# Altium footprint library GyokuRe.PcbLib: 1248 footprints (part 75 of 78)
Each footprint in its own frame and in the unit in brackets; x right, y up, seen from the top. Pads: shape width x height; smd on the part's side, far side on the other; paste and mask are expansions set on the pad; w line width, h text height; cw(c..) or ccw(c..) is an arc to the next point about the centre after c.
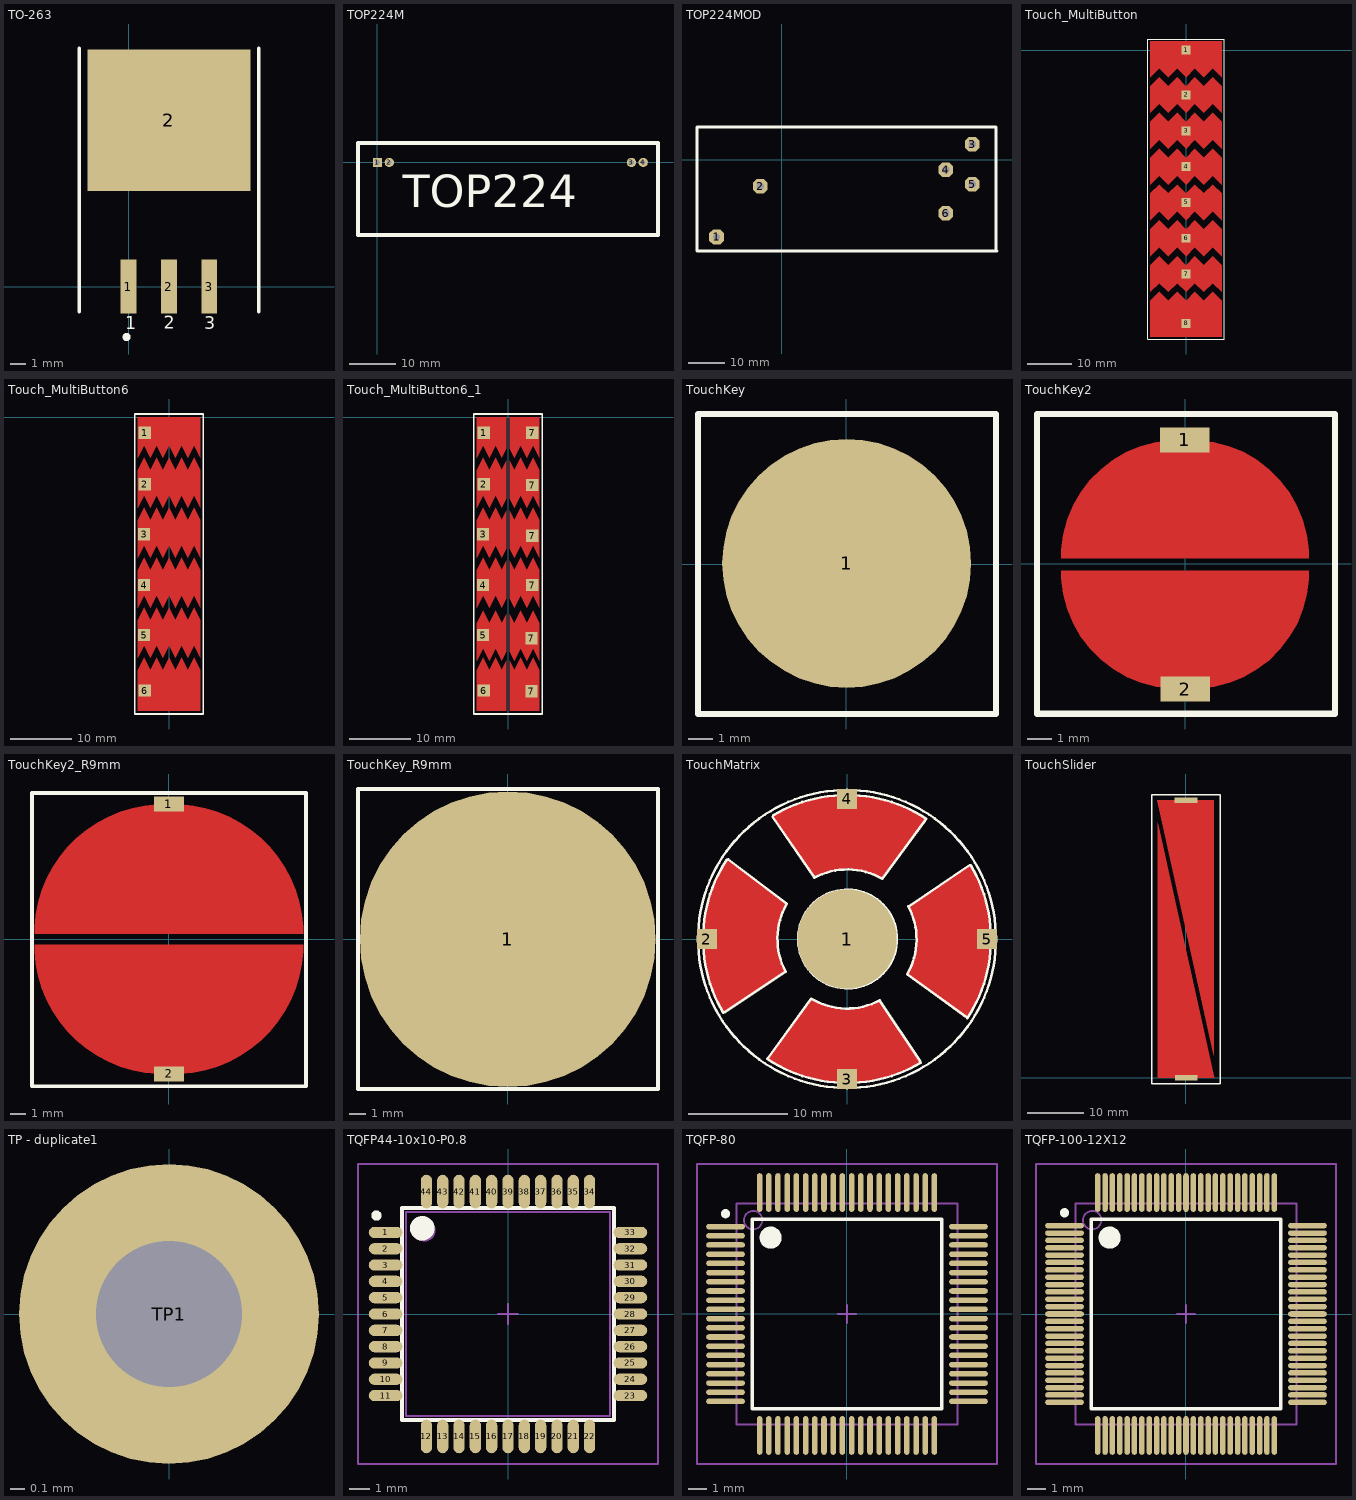
[diagram p74: the footprints below, top view; thin cyan lines are the x and y axes]

## TO-263 [mm]
pads (4):
  rect 1x3.4 smd: 1(-0.006,0.009) 2(2.534,0.009) 3(5.074,0.009)
  rect 10.25x8.9 smd: 2(2.534,10.459)
Top Overlay:
  circle w0.25: c-0.126,-3.166 r0.125
  lines w0.2: -3.106,-1.591 -3.106,15.009 ; 8.194,-1.591 8.194,15.009
  text "2" at 2.213,-2.653 h0.8
  text "3" at 4.774,-2.691 h0.8
  text "1" at -0.201,-2.666 h0.8
Mechanical 13:
  text ".Designator" at -1.422,4.521 h2.03
3D body: height 2.9, standoff 0, extent 4.694,0.75 5.456,1.25
3D body: height 2.9, standoff 0, extent -0.381,0.76 0.381,1.26
3D body: height 0.5, standoff 0, extent 4.694,-1.153 5.456,1
3D body: height 2.9, standoff 2.4, extent 4.475,1 5.675,3.8
3D body: height 2.9, standoff 2.4, extent 1.94,2.375 3.14,3.81
3D body: height 2.9, standoff 2.4, extent -0.6,1.01 0.6,3.81
3D body: height 1.3, standoff 0, extent -2.46,13.01 7.54,14.21
3D body: height 4.5, standoff 0, extent -2.46,3.81 7.54,13.01
3D body: height 0.5, standoff 0, extent -0.381,-1.143 0.381,1.01

## TOP224M [mm] "module TOP224"
pads (4):
  rect 2x2 hole 1: 1(0,0)
  round 2 hole 1: 2(2.54,0) 3(54.61,0) 4(57.15,0)
Top Overlay:
  lines w0.8: -4.191,-15.621 -4.191,4.191 60.325,4.191 60.325,-15.621 -4.191,-15.621
  text "TOP224" at 5.461,-9.652 h7

## TOP224MOD [mm]
pads (6):
  oct 4x4 hole 2: 1(-17.78,-21.082) 2(-5.842,-7.239) 3(51.943,4.191) 4(44.704,-2.794) 5(51.943,-6.731) 6(44.704,-14.605)
Bottom Layer:
  lines w1.016: -5.842,-7.239 -5.715,-7.112
  lines w1.524: -17.78,-21.082 -16.51,-21.082
Top Overlay:
  lines w0.762: -23.114,-24.892 -23.114,8.89 58.42,8.89 58.42,-24.638 58.674,-24.892 -23.114,-24.892

## Touch_MultiButton [mm]
pads (8):
  rect 2x2 smd paste+0 mask+0: 1(0,0) 2(0,-10) 3(0,-18) 4(0,-26) 5(0,-34) 6(0,-42) 7(0,-50) 8(0,-61)
Top Layer:
  region: 8,-40 6,-38 4,-40 2,-38 0,-40 -2,-38 -4,-40 -6,-38 -8,-40 -8,-46 -6,-44 -4,-46 -2,-44 0,-46 2,-44 4,-46 6,-44 8,-46
  region: 8,-48 6,-46 4,-48 2,-46 0,-48 -2,-46 -4,-48 -6,-46 -8,-48 -8,-54 -6,-52 -4,-54 -2,-52 0,-54 2,-52 4,-54 6,-52 8,-54
  region: 8,-32 6,-30 4,-32 2,-30 0,-32 -2,-30 -4,-32 -6,-30 -8,-32 -8,-38 -6,-36 -4,-38 -2,-36 0,-38 2,-36 4,-38 6,-36 8,-38
  region: 8,-24 6,-22 4,-24 2,-22 0,-24 -2,-22 -4,-24 -6,-22 -8,-24 -8,-30 -6,-28 -4,-30 -2,-28 0,-30 2,-28 4,-30 6,-28 8,-30
  region: -8,-64 -8,-56 -7,-55 -6,-54 -4,-56 -2,-54 0,-56 2,-54 4,-56 6,-54 7,-55 8,-56 8,-64
  region: 8,-16 6,-14 4,-16 2,-14 0,-16 -2,-14 -4,-16 -6,-14 -8,-16 -8,-22 -6,-20 -4,-22 -2,-20 0,-22 2,-20 4,-22 6,-20 8,-22
  region: 8,-8 6,-6 4,-8 2,-6 0,-8 -2,-6 -4,-8 -6,-6 -8,-8 -8,-14 -6,-12 -4,-14 -2,-12 0,-14 2,-12 4,-14 6,-12 8,-14
  region: 8,2 8,-6 7,-5 6,-4 4,-6 3,-5 2,-4 0,-6 -2,-4 -3,-5 -4,-6 -6,-4 -7,-5 -8,-6 -8,2
Top Overlay:
  lines w0.254: -8.5,-64.5 8.5,-64.5 8.5,2.5 -8.5,2.5 -8.5,-64.5

## Touch_MultiButton6 [mm]
pads (6):
  rect 2x2 smd paste+0 mask+0: 1(-3.937,-2.54) 2(-3.937,-10.922) 3(-4.064,-19.05) 4(-4.064,-27.305) 5(-4.064,-35.433) 6(-3.937,-44.45)
Top Layer:
  region: 5.08,0 5.08,-6.604 4.064,-4.572 3.048,-6.604 2.032,-4.572 1.016,-6.604 0,-4.572 -1.016,-6.604 -2.032,-4.572 -3.048,-6.604 -4.064,-4.572 -5.08,-6.604 -5.08,0
  region: 5.08,-8.636 4.064,-6.604 3.048,-8.636 2.032,-6.604 1.016,-8.636 0,-6.604 -1.016,-8.636 -2.032,-6.604 -3.048,-8.636 -4.064,-6.604 -5.08,-8.636 -5.08,-14.732 -4.064,-12.7 -3.048,-14.732 -2.032,-12.7 -1.016,-14.732 0,-12.7 1.016,-14.732 2.032,-12.7 3.048,-14.732 4.064,-12.7 5.08,-14.732
  region: 5.08,-16.764 4.064,-14.732 3.048,-16.764 2.032,-14.732 1.016,-16.764 0,-14.732 -1.016,-16.764 -2.032,-14.732 -3.048,-16.764 -4.064,-14.732 -5.08,-16.764 -5.08,-22.86 -4.064,-20.828 -3.048,-22.86 -2.032,-20.828 -1.016,-22.86 0,-20.828 1.016,-22.86 2.032,-20.828 3.048,-22.86 4.064,-20.828 5.08,-22.86
  region: 5.08,-24.892 4.064,-22.86 3.048,-24.892 2.032,-22.86 1.016,-24.892 0,-22.86 -1.016,-24.892 -2.032,-22.86 -3.048,-24.892 -4.064,-22.86 -5.08,-24.892 -5.08,-30.988 -4.064,-28.956 -3.048,-30.988 -2.032,-28.956 -1.016,-30.988 0,-28.956 1.016,-30.988 2.032,-28.956 3.048,-30.988 4.064,-28.956 5.08,-30.988
  region: 5.08,-33.02 4.064,-30.988 3.048,-33.02 2.032,-30.988 1.016,-33.02 0,-30.988 -1.016,-33.02 -2.032,-30.988 -3.048,-33.02 -4.064,-30.988 -5.08,-33.02 -5.08,-39.116 -4.064,-37.084 -3.048,-39.116 -2.032,-37.084 -1.016,-39.116 0,-37.084 1.016,-39.116 2.032,-37.084 3.048,-39.116 4.064,-37.084 5.08,-39.116
  region: -5.08,-47.752 -5.08,-41.148 -4.064,-39.116 -3.048,-41.148 -2.032,-39.116 -1.016,-41.148 0,-39.116 1.016,-41.148 2.032,-39.116 3.048,-41.148 4.064,-39.116 5.08,-41.148 5.08,-47.752
Top Overlay:
  lines w0.254: -5.588,-48.26 5.588,-48.26 5.588,0.508 -5.588,0.508 -5.588,-48.26

## Touch_MultiButton6_1 [mm]
pads (12):
  rect 2x2 smd paste+0 mask+0: 1(-3.937,-2.54) 2(-3.937,-10.922) 3(-4.064,-19.05) 4(-4.064,-27.305) 5(-4.064,-35.433) 6(-3.937,-44.45) 7(3.81,-44.577) 7(3.81,-35.941) 7(3.937,-27.305) 7(3.937,-19.304) 7(3.937,-11.049) 7(3.937,-2.54)
Top Layer:
  region: -0.254,0 -0.254,-5.08 -1.016,-6.604 -2.032,-4.572 -3.048,-6.604 -4.064,-4.572 -5.08,-6.604 -5.08,0
  region: -0.254,-7.112 -1.016,-8.636 -2.032,-6.604 -3.048,-8.636 -4.064,-6.604 -5.08,-8.636 -5.08,-14.732 -4.064,-12.7 -3.048,-14.732 -2.032,-12.7 -1.016,-14.732 -0.254,-13.208
  region: -5.08,-47.752 -5.08,-41.148 -4.064,-39.116 -3.048,-41.148 -2.032,-39.116 -1.016,-41.148 -0.254,-39.624 -0.254,-47.752
  region: 5.08,0 5.08,-6.604 4.064,-4.572 3.048,-6.604 2.032,-4.572 1.016,-6.604 0.254,-5.08 0.254,0
  region: 5.08,-8.636 4.064,-6.604 3.048,-8.636 2.032,-6.604 1.016,-8.636 0.254,-7.112 0.254,-13.208 1.016,-14.732 2.032,-12.7 3.048,-14.732 4.064,-12.7 5.08,-14.732
  region: 5.08,-16.764 4.064,-14.732 3.048,-16.764 2.032,-14.732 1.016,-16.764 0.254,-15.24 0.254,-21.336 1.016,-22.86 2.032,-20.828 3.048,-22.86 4.064,-20.828 5.08,-22.86
  region: -0.254,-15.24 -1.016,-16.764 -2.032,-14.732 -3.048,-16.764 -4.064,-14.732 -5.08,-16.764 -5.08,-22.86 -4.064,-20.828 -3.048,-22.86 -2.032,-20.828 -1.016,-22.86 -0.254,-21.336
  region: 5.08,-24.892 4.064,-22.86 3.048,-24.892 2.032,-22.86 1.016,-24.892 0.254,-23.368 0.254,-29.464 1.016,-30.988 2.032,-28.956 3.048,-30.988 4.064,-28.956 5.08,-30.988
  region: -0.254,-23.368 -1.016,-24.892 -2.032,-22.86 -3.048,-24.892 -4.064,-22.86 -5.08,-24.892 -5.08,-30.988 -4.064,-28.956 -3.048,-30.988 -2.032,-28.956 -1.016,-30.988 -0.254,-29.464
  region: 5.08,-33.528 4.064,-31.496 3.048,-33.528 2.032,-31.496 1.016,-33.528 0.254,-32.004 0.254,-38.1 1.016,-39.624 2.032,-37.592 3.048,-39.624 4.064,-37.592 5.08,-39.624
  region: -0.254,-32.004 -1.016,-33.528 -2.032,-31.496 -3.048,-33.528 -4.064,-31.496 -5.08,-33.528 -5.08,-39.624 -4.064,-37.592 -3.048,-39.624 -2.032,-37.592 -1.016,-39.624 -0.254,-38.1
  region: 0.254,-47.752 0.254,-39.624 1.016,-41.148 2.032,-39.116 3.048,-41.148 4.064,-39.116 5.08,-41.148 5.08,-47.752
Top Overlay:
  lines w0.254: -5.588,-48.26 5.588,-48.26 5.588,0.508 -5.588,0.508 -5.588,-48.26

## TouchKey [mm] "Radius 5mm"
pads (1):
  round 10 smd mask+0: 1(0.025,0.025)
Top Overlay:
  lines w0.254: -5.95,-6.025 -5.95,6.025 6.025,6.025 6.025,-6.025 -5.95,-6.025

## TouchKey2 [mm] "Radius 5mm"
pads (2):
  rect 2x1 smd mask+0: 1(-0.012,4.983) 2(0.012,-5.034)
Top Layer:
  region: -0.253,4.978 -0.563,4.978 -1.177,4.898 -1.775,4.737 -2.347,4.5 -2.884,4.19 -3.375,3.813 -3.813,3.375 -4.19,2.884 -4.5,2.347 -4.737,1.775 -4.898,1.177 -4.978,0.563 -4.978,0.253 -4.978,0.229 4.978,0.229 4.978,0.54 4.897,1.157 4.736,1.759 4.498,2.334 4.186,2.873 3.807,3.367 3.367,3.807 2.873,4.186 2.334,4.498 1.759,4.736 1.157,4.897 0.54,4.978 0.229,4.978
  region: 0.253,-5.029 0.563,-5.029 1.177,-4.948 1.775,-4.788 2.347,-4.551 2.884,-4.241 3.375,-3.864 3.813,-3.426 4.19,-2.935 4.5,-2.398 4.737,-1.826 4.898,-1.228 4.978,-0.613 4.978,-0.304 4.978,-0.279 -4.978,-0.279 -4.978,-0.591 -4.897,-1.208 -4.736,-1.809 -4.498,-2.385 -4.186,-2.924 -3.807,-3.418 -3.367,-3.858 -2.873,-4.237 -2.334,-4.549 -1.759,-4.787 -1.157,-4.948 -0.54,-5.029 -0.229,-5.029
Top Overlay:
  lines w0.254: -5.95,-6.025 -5.95,6.025 6.025,6.025 6.025,-6.025 -5.95,-6.025

## TouchKey2_R9mm [mm] "Radius 9mm"
pads (2):
  rect 2x1 smd paste+0 mask+0: 1(0,8.992) 2(0.025,-8.992)
Top Layer:
  region: 0.33,-8.992 0.753,-8.992 1.595,-8.909 2.425,-8.744 3.235,-8.498 4.016,-8.174 4.762,-7.775 5.466,-7.305 6.12,-6.769 6.718,-6.17 7.255,-5.517 7.725,-4.813 8.123,-4.067 8.447,-3.285 8.693,-2.476 8.858,-1.646 8.941,-0.804 8.941,-0.381 -8.941,-0.381 -8.941,-0.804 -8.858,-1.646 -8.693,-2.476 -8.447,-3.285 -8.123,-4.067 -7.725,-4.813 -7.255,-5.517 -6.718,-6.17 -6.12,-6.769 -5.466,-7.305 -4.762,-7.775 -4.016,-8.174 -3.235,-8.498 -2.425,-8.744 -1.595,-8.909 -0.753,-8.992 -0.33,-8.992
  region: -0.33,8.966 -0.753,8.966 -1.595,8.883 -2.425,8.718 -3.235,8.473 -4.016,8.149 -4.762,7.75 -5.466,7.28 -6.12,6.743 -6.718,6.145 -7.255,5.491 -7.725,4.788 -8.123,4.042 -8.447,3.26 -8.693,2.45 -8.858,1.621 -8.941,0.779 -8.941,0.356 8.941,0.356 8.941,0.779 8.858,1.621 8.693,2.45 8.447,3.26 8.123,4.042 7.725,4.788 7.255,5.491 6.718,6.145 6.12,6.743 5.466,7.28 4.762,7.75 4.016,8.149 3.235,8.473 2.425,8.718 1.595,8.883 0.753,8.966 0.33,8.966
Top Overlay:
  lines w0.254: -9.119,-9.804 -9.119,9.728 9.144,9.728 9.144,-9.804 -9.119,-9.804

## TouchKey_R9mm [mm] "Radius 9mm"
pads (1):
  round 18 smd paste+0 mask+0: 1(0,0)
Top Overlay:
  lines w0.254: -9.119,-9.119 -9.119,9.144 9.144,9.144 9.144,-9.119 -9.119,-9.119

## TouchMatrix [mm]
pads (5):
  round 10 smd paste+0 mask+0: 1(0,0)
  rect 2x2 smd paste+0 mask+0: 2(-14.097,0) 3(0,-14.097) 4(0,14.097) 5(14.097,0)
Top Layer:
  region: -3.302,6.223 -7.366,12.192 -7.366,12.319 -7.366,12.395 -7.308,12.535 -7.201,12.642 -7.061,12.7 -6.985,12.7 -4.699,13.716 -1.905,14.351 0.635,14.478 3.175,14.097 5.08,13.589 7.62,12.319 7.671,12.319 7.764,12.28 7.835,12.209 7.874,12.116 7.874,12.065 7.874,11.811 3.556,6.096 2.54,6.604 1.27,6.858 0.254,7.112 -1.27,6.985 -2.667,6.477
  region: 6.223,3.302 12.192,7.366 12.319,7.366 12.395,7.366 12.535,7.308 12.642,7.201 12.7,7.061 12.7,6.985 13.716,4.699 14.351,1.905 14.478,-0.635 14.097,-3.175 13.589,-5.08 12.319,-7.62 12.319,-7.671 12.28,-7.764 12.209,-7.835 12.116,-7.874 12.065,-7.874 11.811,-7.874 6.096,-3.556 6.604,-2.54 6.858,-1.27 7.112,-0.254 6.985,1.27 6.477,2.667
  region: -6.223,-3.302 -12.192,-7.366 -12.319,-7.366 -12.395,-7.366 -12.535,-7.308 -12.642,-7.201 -12.7,-7.061 -12.7,-6.985 -13.716,-4.699 -14.351,-1.905 -14.478,0.635 -14.097,3.175 -13.589,5.08 -12.319,7.62 -12.319,7.671 -12.28,7.764 -12.209,7.835 -12.116,7.874 -12.065,7.874 -11.811,7.874 -6.096,3.556 -6.604,2.54 -6.858,1.27 -7.112,0.254 -6.985,-1.27 -6.477,-2.667
  region: 3.302,-6.223 7.366,-12.192 7.366,-12.319 7.366,-12.395 7.308,-12.535 7.201,-12.642 7.061,-12.7 6.985,-12.7 4.699,-13.716 1.905,-14.351 -0.635,-14.478 -3.175,-14.097 -5.08,-13.589 -7.62,-12.319 -7.671,-12.319 -7.764,-12.28 -7.835,-12.209 -7.874,-12.116 -7.874,-12.065 -7.874,-11.811 -3.556,-6.096 -2.54,-6.604 -1.27,-6.858 -0.254,-7.112 1.27,-6.985 2.667,-6.477
Top Overlay:
  circle w0.254: c0,0 r15
  circle w0.254: c0.051,0 r4.973
  lines w0.254: -12.445,-7.441 cw(c0,0) -12.099,7.992 ; -12.319,-7.366 -6.223,-3.302 ; -11.938,8.001 -6.096,3.556 ; -8.001,-12.065 -3.683,-6.096 ; -7.992,-12.099 ccw(c0,0) 7.441,-12.445 ; -7.493,12.319 -3.299,6.225 ; -7.441,12.445 cw(c0,0) 7.992,12.099 ; -6.177,-3.278 cw(c0,0.015) -6.053,3.531 ; -3.605,-6.009 ccw(c-0.015,0) 3.292,-6.17 ; -3.292,6.17 cw(c0.015,0) 3.531,6.053 ; 3.302,-6.223 7.366,-12.319 ; 3.556,6.096 7.874,11.938 ; 6.053,-3.531 ccw(c0,-0.015) 6.17,3.292 ; 6.096,-3.556 12.065,-7.874 ; 6.294,3.333 12.354,7.441 ; 12.099,-7.992 ccw(c0,0) 12.445,7.441

## TouchSlider [mm]
pads (2):
  rect 4x1 smd paste+0 mask+0: 1(0.025,0.025) 2(0,49.025)
Top Layer:
  region: 5,0.025 -5,0.05 -4.975,45.05
  region: -5.1,49.025 4.9,49 4.875,4
Top Overlay:
  lines w0.254: -6,-1.025 6.025,-1.025 6.025,50.025 -6,50.025 -6,-1.025

## TP - duplicate1 [mil] "Connect 1"
pads (1):
  round 80 hole 39: TP1(0,0)
3D body "socket 1-1.stp": height 178.54, standoff -113.98, extent -50,-50 50,50

## TQFP44-10x10-P0.8 [mm] "QFP, 44-Leads, Body 10x10mm, Pitch 0.8mm, IPC High Density"
height 2.44
pads (44):
  oval 1.65x0.55 smd: 1(-6,4) 2(-6,3.2) 3(-6,2.4) 4(-6,1.6) 5(-6,0.8) 6(-6,0) 7(-6,-0.8) 8(-6,-1.6) 9(-6,-2.4) 10(-6,-3.2) 11(-6,-4) 23(6,-4) 24(6,-3.2) 25(6,-2.4) 26(6,-1.6) 27(6,-0.8) 28(6,0) 29(6,0.8) 30(6,1.6) 31(6,2.4) 32(6,3.2) 33(6,4)
  oval 0.55x1.65 smd: 12(-4,-6) 13(-3.2,-6) 14(-2.4,-6) 15(-1.6,-6) 16(-0.8,-6) 17(0,-6) 18(0.8,-6) 19(1.6,-6) 20(2.4,-6) 21(3.2,-6) 22(4,-6) 34(4,6) 35(3.2,6) 36(2.4,6) 37(1.6,6) 38(0.8,6) 39(0,6) 40(-0.8,6) 41(-1.6,6) 42(-2.4,6) 43(-3.2,6) 44(-4,6)
Top Overlay:
  circle w0.6: c-4.2,4.2 r0.3
  circle w0.25: c-6.45,4.825 r0.125
  lines w0.2: -5.2,-5.2 5.2,-5.2 5.2,5.2 -5.2,5.2 -5.2,-5.2
Mechanical 13:
  circle w0.1: c-4.1,4.1 r0.5
  lines w0.1: -5,-5 5,-5 5,5 -5,5 -5,-5
Mechanical 15:
  lines w0.1: -0.5,0 0.5,0 ; 0,-0.5 0,0.5 ; -7.35,-7.35 7.35,-7.35 7.35,7.35 -7.35,7.35 -7.35,-7.35
3D body "User Library-TQFP44.step": height 1.07, standoff 0, extent -5.994,-5.994 6.006,6.006

## TQFP-80 [mm] "Thin QFP, 80-Leads, Body 12x12mm, Pitch 0.5mm, IPC Low Density"
height 1.2
pads (80):
  oval 2.1x0.3 smd: 1(-6.6,4.75) 2(-6.6,4.25) 3(-6.6,3.75) 4(-6.6,3.25) 5(-6.6,2.75) 6(-6.6,2.25) 7(-6.6,1.75) 8(-6.6,1.25) 9(-6.6,0.75) 10(-6.6,0.25) 11(-6.6,-0.25) 12(-6.6,-0.75) 13(-6.6,-1.25) 14(-6.6,-1.75) 15(-6.6,-2.25) 16(-6.6,-2.75) 17(-6.6,-3.25) 18(-6.6,-3.75) 19(-6.6,-4.25) 20(-6.6,-4.75) 41(6.6,-4.75) 42(6.6,-4.25) 43(6.6,-3.75) 44(6.6,-3.25) 45(6.6,-2.75) 46(6.6,-2.25) 47(6.6,-1.75) 48(6.6,-1.25) 49(6.6,-0.75) 50(6.6,-0.25) 51(6.6,0.25) 52(6.6,0.75) 53(6.6,1.25) 54(6.6,1.75) 55(6.6,2.25) 56(6.6,2.75) 57(6.6,3.25) 58(6.6,3.75) 59(6.6,4.25) 60(6.6,4.75)
  oval 0.3x2.1 smd: 21(-4.75,-6.6) 22(-4.25,-6.6) 23(-3.75,-6.6) 24(-3.25,-6.6) 25(-2.75,-6.6) 26(-2.25,-6.6) 27(-1.75,-6.6) 28(-1.25,-6.6) 29(-0.75,-6.6) 30(-0.25,-6.6) 31(0.25,-6.6) 32(0.75,-6.6) 33(1.25,-6.6) 34(1.75,-6.6) 35(2.25,-6.6) 36(2.75,-6.6) 37(3.25,-6.6) 38(3.75,-6.6) 39(4.25,-6.6) 40(4.75,-6.6) 61(4.75,6.6) 62(4.25,6.6) 63(3.75,6.6) 64(3.25,6.6) 65(2.75,6.6) 66(2.25,6.6) 67(1.75,6.6) 68(1.25,6.6) 69(0.75,6.6) 70(0.25,6.6) 71(-0.25,6.6) 72(-0.75,6.6) 73(-1.25,6.6) 74(-1.75,6.6) 75(-2.25,6.6) 76(-2.75,6.6) 77(-3.25,6.6) 78(-3.75,6.6) 79(-4.25,6.6) 80(-4.75,6.6)
Top Overlay:
  circle w0.6: c-4.15,4.15 r0.3
  circle w0.25: c-6.6,5.45 r0.125
  lines w0.2: -5.15,-5.15 5.15,-5.15 5.15,5.15 -5.15,5.15 -5.15,-5.15
Mechanical 13:
  circle w0.1: c-5.1,5.1 r0.5
  lines w0.1: -6,-6 6,-6 6,6 -6,6 -6,-6
Mechanical 15:
  lines w0.1: -0.5,0 0.5,0 ; 0,-0.5 0,0.5 ; -8.15,-8.15 8.15,-8.15 8.15,8.15 -8.15,8.15 -8.15,-8.15
3D body: height 1.2, standoff 0, extent -6,-6 6,6

## TQFP-100-12X12 [mm] "Shrink QFP, 100-Leads, Body 12x12mm, Pitch 0.4mm, IPC High Density"
height 2.2
pads (100):
  oval 2.1x0.3 smd: 1(-6.6,4.8) 2(-6.6,4.4) 3(-6.6,4) 4(-6.6,3.6) 5(-6.6,3.2) 6(-6.6,2.8) 7(-6.6,2.4) 8(-6.6,2) 9(-6.6,1.6) 10(-6.6,1.2) 11(-6.6,0.8) 12(-6.6,0.4) 13(-6.6,0) 14(-6.6,-0.4) 15(-6.6,-0.8) 16(-6.6,-1.2) 17(-6.6,-1.6) 18(-6.6,-2) 19(-6.6,-2.4) 20(-6.6,-2.8) 21(-6.6,-3.2) 22(-6.6,-3.6) 23(-6.6,-4) 24(-6.6,-4.4) 25(-6.6,-4.8) 51(6.6,-4.8) 52(6.6,-4.4) 53(6.6,-4) 54(6.6,-3.6) 55(6.6,-3.2) 56(6.6,-2.8) 57(6.6,-2.4) 58(6.6,-2) 59(6.6,-1.6) 60(6.6,-1.2) 61(6.6,-0.8) 62(6.6,-0.4) 63(6.6,0) 64(6.6,0.4) 65(6.6,0.8) 66(6.6,1.2) 67(6.6,1.6) 68(6.6,2) 69(6.6,2.4) 70(6.6,2.8) 71(6.6,3.2) 72(6.6,3.6) 73(6.6,4) 74(6.6,4.4) 75(6.6,4.8)
  oval 0.3x2.1 smd: 26(-4.8,-6.6) 27(-4.4,-6.6) 28(-4,-6.6) 29(-3.6,-6.6) 30(-3.2,-6.6) 31(-2.8,-6.6) 32(-2.4,-6.6) 33(-2,-6.6) 34(-1.6,-6.6) 35(-1.2,-6.6) 36(-0.8,-6.6) 37(-0.4,-6.6) 38(0,-6.6) 39(0.4,-6.6) 40(0.8,-6.6) 41(1.2,-6.6) 42(1.6,-6.6) 43(2,-6.6) 44(2.4,-6.6) 45(2.8,-6.6) 46(3.2,-6.6) 47(3.6,-6.6) 48(4,-6.6) 49(4.4,-6.6) 50(4.8,-6.6) 76(4.8,6.6) 77(4.4,6.6) 78(4,6.6) 79(3.6,6.6) 80(3.2,6.6) 81(2.8,6.6) 82(2.4,6.6) 83(2,6.6) 84(1.6,6.6) 85(1.2,6.6) 86(0.8,6.6) 87(0.4,6.6) 88(0,6.6) 89(-0.4,6.6) 90(-0.8,6.6) 91(-1.2,6.6) 92(-1.6,6.6) 93(-2,6.6) 94(-2.4,6.6) 95(-2.8,6.6) 96(-3.2,6.6) 97(-3.6,6.6) 98(-4,6.6) 99(-4.4,6.6) 100(-4.8,6.6)
Top Overlay:
  circle w0.6: c-4.15,4.15 r0.3
  circle w0.25: c-6.6,5.5 r0.125
  lines w0.2: -5.15,-5.15 5.15,-5.15 5.15,5.15 -5.15,5.15 -5.15,-5.15
Mechanical 13:
  circle w0.1: c-5.1,5.1 r0.5
  lines w0.1: -6,-6 6,-6 6,6 -6,6 -6,-6
Mechanical 15:
  lines w0.1: -0.5,0 0.5,0 ; 0,-0.5 0,0.5 ; -8.15,-8.15 8.15,-8.15 8.15,8.15 -8.15,8.15 -8.15,-8.15
3D body: height 2.2, standoff 0, extent -6,-6 6,6